# Altium schematic symbol library jlcpcb_2025_04_resistors_extended_2010.schlib: 1697 symbols (part 5 of 9) (continued)
## CR2010J27R0E04Z
designator R?  Resistance: 27Ω  (hidden comment: *)
Resistor, 27Ω, ±5%, 750mW, 200V, ±100ppm/℃, -55℃~+155℃, SMD 2010; Manufacturer: Uniroyal; Manufacturer Part Number: CR2010J27R0E04Z; Supplier 1: LCSC; Supplier Part Number 1: C175146; JLCPCB Part Number: C175146; Power Rating: 750mW; Category: Resistors; Package Size: 2010; JLCPCB Basic Part: Yes; Tolerance: ±5%; Voltage Rating: 200V; Temperature Coefficient: ±100ppm/℃; Temperature Rating: -55℃~+155℃; ComponentLink1Description: Datasheet; ComponentLink1URL: https://wmsc.lcsc.com/wmsc/upload/file/pdf/v2/lcsc/2304140030_Ever-Ohms-Tech-CR2010J27R0E04Z_C175146.pdf; ComponentLink2Description: JLCPCB Part URL; ComponentLink2URL: https://jlcpcb.com/partdetail/C175146
pins: 1, 2
1 alternate drawing of the same symbol

## CR2010J33K0E04Z
designator R?  Resistance: 33kΩ  (hidden comment: *)
Resistor, 33kΩ, ±5%, 750mW, 200V, ±100ppm/℃, -55℃~+155℃, SMD 2010; Manufacturer: Uniroyal; Manufacturer Part Number: CR2010J33K0E04Z; Supplier 1: LCSC; Supplier Part Number 1: C175178; JLCPCB Part Number: C175178; Power Rating: 750mW; Category: Resistors; Package Size: 2010; JLCPCB Basic Part: Yes; Tolerance: ±5%; Voltage Rating: 200V; Temperature Coefficient: ±100ppm/℃; Temperature Rating: -55℃~+155℃; ComponentLink1Description: Datasheet; ComponentLink1URL: https://wmsc.lcsc.com/wmsc/upload/file/pdf/v2/lcsc/2304140030_Ever-Ohms-Tech-CR2010J33K0E04Z_C175178.pdf; ComponentLink2Description: JLCPCB Part URL; ComponentLink2URL: https://jlcpcb.com/partdetail/C175178
pins: 1, 2
1 alternate drawing of the same symbol

## CR2010J33R0E04Z
designator R?  Resistance: 33Ω  (hidden comment: *)
Resistor, 33Ω, ±5%, 750mW, 200V, ±100ppm/℃, -55℃~+155℃, SMD 2010; Manufacturer: Uniroyal; Manufacturer Part Number: CR2010J33R0E04Z; Supplier 1: LCSC; Supplier Part Number 1: C175147; JLCPCB Part Number: C175147; Power Rating: 750mW; Category: Resistors; Package Size: 2010; JLCPCB Basic Part: Yes; Tolerance: ±5%; Voltage Rating: 200V; Temperature Coefficient: ±100ppm/℃; Temperature Rating: -55℃~+155℃; ComponentLink1Description: Datasheet; ComponentLink1URL: https://wmsc.lcsc.com/wmsc/upload/file/pdf/v2/lcsc/2304140030_Ever-Ohms-Tech-CR2010J33R0E04Z_C175147.pdf; ComponentLink2Description: JLCPCB Part URL; ComponentLink2URL: https://jlcpcb.com/partdetail/C175147
pins: 1, 2
1 alternate drawing of the same symbol

## CR2010J36R0E04Z
designator R?  Resistance: 36Ω  (hidden comment: *)
Resistor, 36Ω, ±5%, 750mW, 200V, ±100ppm/℃, -55℃~+155℃, SMD 2010; Manufacturer: Uniroyal; Manufacturer Part Number: CR2010J36R0E04Z; Supplier 1: LCSC; Supplier Part Number 1: C175148; JLCPCB Part Number: C175148; Power Rating: 750mW; Category: Resistors; Package Size: 2010; JLCPCB Basic Part: Yes; Tolerance: ±5%; Voltage Rating: 200V; Temperature Coefficient: ±100ppm/℃; Temperature Rating: -55℃~+155℃; ComponentLink1Description: Datasheet; ComponentLink1URL: https://wmsc.lcsc.com/wmsc/upload/file/pdf/v2/lcsc/2304140030_Ever-Ohms-Tech-CR2010J36R0E04Z_C175148.pdf; ComponentLink2Description: JLCPCB Part URL; ComponentLink2URL: https://jlcpcb.com/partdetail/C175148
pins: 1, 2
1 alternate drawing of the same symbol

## CR2010J39K0E04Z
designator R?  Resistance: 39kΩ  (hidden comment: *)
Resistor, 39kΩ, ±5%, 750mW, 200V, ±100ppm/℃, -55℃~+155℃, SMD 2010; Manufacturer: Uniroyal; Manufacturer Part Number: CR2010J39K0E04Z; Supplier 1: LCSC; Supplier Part Number 1: C147239; JLCPCB Part Number: C147239; Power Rating: 750mW; Category: Resistors; Package Size: 2010; JLCPCB Basic Part: Yes; Tolerance: ±5%; Voltage Rating: 200V; Temperature Coefficient: ±100ppm/℃; Temperature Rating: -55℃~+155℃; ComponentLink1Description: Datasheet; ComponentLink1URL: https://wmsc.lcsc.com/wmsc/upload/file/pdf/v2/lcsc/2304140030_Ever-Ohms-Tech-CR2010J39K0E04Z_C147239.pdf; ComponentLink2Description: JLCPCB Part URL; ComponentLink2URL: https://jlcpcb.com/partdetail/C147239
pins: 1, 2
1 alternate drawing of the same symbol

## CR2010J39R0E04Z
designator R?  Resistance: 39Ω  (hidden comment: *)
Resistor, 39Ω, ±5%, 750mW, 200V, ±100ppm/℃, -55℃~+155℃, SMD 2010; Manufacturer: Uniroyal; Manufacturer Part Number: CR2010J39R0E04Z; Supplier 1: LCSC; Supplier Part Number 1: C175149; JLCPCB Part Number: C175149; Power Rating: 750mW; Category: Resistors; Package Size: 2010; JLCPCB Basic Part: Yes; Tolerance: ±5%; Voltage Rating: 200V; Temperature Coefficient: ±100ppm/℃; Temperature Rating: -55℃~+155℃; ComponentLink1Description: Datasheet; ComponentLink1URL: https://wmsc.lcsc.com/wmsc/upload/file/pdf/v2/lcsc/2304140030_Ever-Ohms-Tech-CR2010J39R0E04Z_C175149.pdf; ComponentLink2Description: JLCPCB Part URL; ComponentLink2URL: https://jlcpcb.com/partdetail/C175149
pins: 1, 2
1 alternate drawing of the same symbol

## CR2010J47R0E04Z
designator R?  Resistance: 47Ω  (hidden comment: *)
Resistor, 47Ω, ±5%, 750mW, 200V, ±100ppm/℃, -55℃~+155℃, SMD 2010; Manufacturer: Uniroyal; Manufacturer Part Number: CR2010J47R0E04Z; Supplier 1: LCSC; Supplier Part Number 1: C146854; JLCPCB Part Number: C146854; Power Rating: 750mW; Category: Resistors; Package Size: 2010; JLCPCB Basic Part: Yes; Tolerance: ±5%; Voltage Rating: 200V; Temperature Coefficient: ±100ppm/℃; Temperature Rating: -55℃~+155℃; ComponentLink1Description: Datasheet; ComponentLink1URL: https://wmsc.lcsc.com/wmsc/upload/file/pdf/v2/lcsc/2304140030_Ever-Ohms-Tech-CR2010J47R0E04Z_C146854.pdf; ComponentLink2Description: JLCPCB Part URL; ComponentLink2URL: https://jlcpcb.com/partdetail/C146854
pins: 1, 2
1 alternate drawing of the same symbol

## CR2010J51K0E04Z
designator R?  Resistance: 51kΩ  (hidden comment: *)
Resistor, 51kΩ, ±5%, 750mW, 200V, ±200ppm/℃, -55℃~+155℃, SMD 2010; Manufacturer: Uniroyal; Manufacturer Part Number: CR2010J51K0E04Z; Supplier 1: LCSC; Supplier Part Number 1: C429680; JLCPCB Part Number: C429680; Power Rating: 750mW; Category: Resistors; Package Size: 2010; JLCPCB Basic Part: Yes; Tolerance: ±5%; Voltage Rating: 200V; Temperature Coefficient: ±200ppm/℃; Temperature Rating: -55℃~+155℃; ComponentLink1Description: Datasheet; ComponentLink1URL: https://wmsc.lcsc.com/wmsc/upload/file/pdf/v2/lcsc/2304140030_Ever-Ohms-Tech-CR2010J51K0E04Z_C429680.pdf; ComponentLink2Description: JLCPCB Part URL; ComponentLink2URL: https://jlcpcb.com/partdetail/C429680
pins: 1, 2
1 alternate drawing of the same symbol

## CR2010J56K0E04Z
designator R?  Resistance: 56kΩ  (hidden comment: *)
Resistor, 56kΩ, ±5%, 750mW, 200V, ±100ppm/℃, -55℃~+155℃, SMD 2010; Manufacturer: Uniroyal; Manufacturer Part Number: CR2010J56K0E04Z; Supplier 1: LCSC; Supplier Part Number 1: C146883; JLCPCB Part Number: C146883; Power Rating: 750mW; Category: Resistors; Package Size: 2010; JLCPCB Basic Part: Yes; Tolerance: ±5%; Voltage Rating: 200V; Temperature Coefficient: ±100ppm/℃; Temperature Rating: -55℃~+155℃; ComponentLink1Description: Datasheet; ComponentLink1URL: https://wmsc.lcsc.com/wmsc/upload/file/pdf/v2/lcsc/2304140030_Ever-Ohms-Tech-CR2010J56K0E04Z_C146883.pdf; ComponentLink2Description: JLCPCB Part URL; ComponentLink2URL: https://jlcpcb.com/partdetail/C146883
pins: 1, 2
1 alternate drawing of the same symbol

## CR2010J62K0E04Z
designator R?  Resistance: 62kΩ  (hidden comment: *)
Resistor, 62kΩ, ±5%, 750mW, 200V, ±100ppm/℃, -55℃~+155℃, SMD 2010; Manufacturer: Uniroyal; Manufacturer Part Number: CR2010J62K0E04Z; Supplier 1: LCSC; Supplier Part Number 1: C175184; JLCPCB Part Number: C175184; Power Rating: 750mW; Category: Resistors; Package Size: 2010; JLCPCB Basic Part: Yes; Tolerance: ±5%; Voltage Rating: 200V; Temperature Coefficient: ±100ppm/℃; Temperature Rating: -55℃~+155℃; ComponentLink1Description: Datasheet; ComponentLink1URL: https://wmsc.lcsc.com/wmsc/upload/file/pdf/v2/lcsc/2304140030_Ever-Ohms-Tech-CR2010J62K0E04Z_C175184.pdf; ComponentLink2Description: JLCPCB Part URL; ComponentLink2URL: https://jlcpcb.com/partdetail/C175184
pins: 1, 2
1 alternate drawing of the same symbol

## CR2010J62R0E04Z
designator R?  Resistance: 62Ω  (hidden comment: *)
Resistor, 62Ω, ±5%, 750mW, 200V, ±100ppm/℃, -55℃~+155℃, SMD 2010; Manufacturer: Uniroyal; Manufacturer Part Number: CR2010J62R0E04Z; Supplier 1: LCSC; Supplier Part Number 1: C146934; JLCPCB Part Number: C146934; Power Rating: 750mW; Category: Resistors; Package Size: 2010; JLCPCB Basic Part: Yes; Tolerance: ±5%; Voltage Rating: 200V; Temperature Coefficient: ±100ppm/℃; Temperature Rating: -55℃~+155℃; ComponentLink1Description: Datasheet; ComponentLink1URL: https://wmsc.lcsc.com/wmsc/upload/file/pdf/v2/lcsc/2304140030_Ever-Ohms-Tech-CR2010J62R0E04Z_C146934.pdf; ComponentLink2Description: JLCPCB Part URL; ComponentLink2URL: https://jlcpcb.com/partdetail/C146934
pins: 1, 2
1 alternate drawing of the same symbol

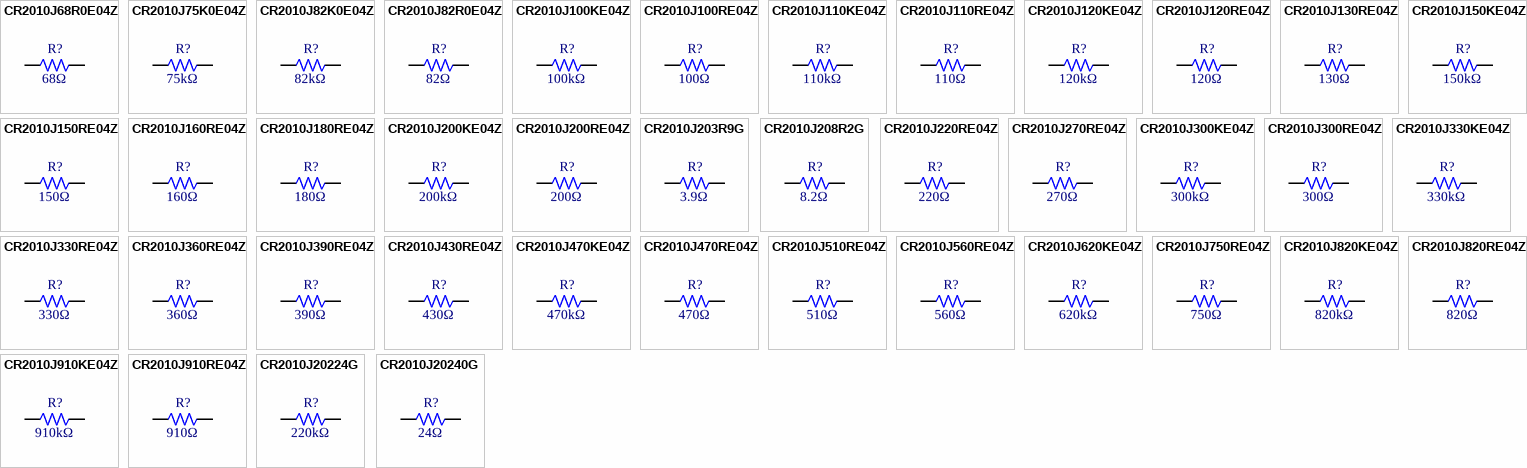
[diagram p21: symbols CR2010J68R0E04Z to CR2010J20240G]

## CR2010J68R0E04Z
designator R?  Resistance: 68Ω  (hidden comment: *)
Resistor, 68Ω, ±5%, 750mW, 200V, ±100ppm/℃, -55℃~+155℃, SMD 2010; Manufacturer: Uniroyal; Manufacturer Part Number: CR2010J68R0E04Z; Supplier 1: LCSC; Supplier Part Number 1: C146864; JLCPCB Part Number: C146864; Power Rating: 750mW; Category: Resistors; Package Size: 2010; JLCPCB Basic Part: Yes; Tolerance: ±5%; Voltage Rating: 200V; Temperature Coefficient: ±100ppm/℃; Temperature Rating: -55℃~+155℃; ComponentLink1Description: Datasheet; ComponentLink1URL: https://wmsc.lcsc.com/wmsc/upload/file/pdf/v2/lcsc/2304140030_Ever-Ohms-Tech-CR2010J68R0E04Z_C146864.pdf; ComponentLink2Description: JLCPCB Part URL; ComponentLink2URL: https://jlcpcb.com/partdetail/C146864
pins: 1, 2
1 alternate drawing of the same symbol

## CR2010J75K0E04Z
designator R?  Resistance: 75kΩ  (hidden comment: *)
Resistor, 75kΩ, ±5%, 750mW, 200V, ±100ppm/℃, -55℃~+155℃, SMD 2010; Manufacturer: Uniroyal; Manufacturer Part Number: CR2010J75K0E04Z; Supplier 1: LCSC; Supplier Part Number 1: C147240; JLCPCB Part Number: C147240; Power Rating: 750mW; Category: Resistors; Package Size: 2010; JLCPCB Basic Part: Yes; Tolerance: ±5%; Voltage Rating: 200V; Temperature Coefficient: ±100ppm/℃; Temperature Rating: -55℃~+155℃; ComponentLink1Description: Datasheet; ComponentLink1URL: https://wmsc.lcsc.com/wmsc/upload/file/pdf/v2/lcsc/2304140030_Ever-Ohms-Tech-CR2010J75K0E04Z_C147240.pdf; ComponentLink2Description: JLCPCB Part URL; ComponentLink2URL: https://jlcpcb.com/partdetail/C147240
pins: 1, 2
1 alternate drawing of the same symbol

## CR2010J82K0E04Z
designator R?  Resistance: 82kΩ  (hidden comment: *)
Resistor, 82kΩ, ±5%, 750mW, 200V, ±100ppm/℃, -55℃~+155℃, SMD 2010; Manufacturer: Uniroyal; Manufacturer Part Number: CR2010J82K0E04Z; Supplier 1: LCSC; Supplier Part Number 1: C165328; JLCPCB Part Number: C165328; Power Rating: 750mW; Category: Resistors; Package Size: 2010; JLCPCB Basic Part: Yes; Tolerance: ±5%; Voltage Rating: 200V; Temperature Coefficient: ±100ppm/℃; Temperature Rating: -55℃~+155℃; ComponentLink1Description: Datasheet; ComponentLink1URL: https://wmsc.lcsc.com/wmsc/upload/file/pdf/v2/lcsc/2304140030_Ever-Ohms-Tech-CR2010J82K0E04Z_C165328.pdf; ComponentLink2Description: JLCPCB Part URL; ComponentLink2URL: https://jlcpcb.com/partdetail/C165328
pins: 1, 2
1 alternate drawing of the same symbol

## CR2010J82R0E04Z
designator R?  Resistance: 82Ω  (hidden comment: *)
Resistor, 82Ω, ±5%, 750mW, 200V, ±100ppm/℃, -55℃~+155℃, SMD 2010; Manufacturer: Uniroyal; Manufacturer Part Number: CR2010J82R0E04Z; Supplier 1: LCSC; Supplier Part Number 1: C175151; JLCPCB Part Number: C175151; Power Rating: 750mW; Category: Resistors; Package Size: 2010; JLCPCB Basic Part: Yes; Tolerance: ±5%; Voltage Rating: 200V; Temperature Coefficient: ±100ppm/℃; Temperature Rating: -55℃~+155℃; ComponentLink1Description: Datasheet; ComponentLink1URL: https://wmsc.lcsc.com/wmsc/upload/file/pdf/v2/lcsc/2304140030_Ever-Ohms-Tech-CR2010J82R0E04Z_C175151.pdf; ComponentLink2Description: JLCPCB Part URL; ComponentLink2URL: https://jlcpcb.com/partdetail/C175151
pins: 1, 2
1 alternate drawing of the same symbol

## CR2010J100KE04Z
designator R?  Resistance: 100kΩ  (hidden comment: *)
Resistor, 100kΩ, ±5%, 750mW, 200V, ±100ppm/℃, -55℃~+155℃, SMD 2010; Manufacturer: Uniroyal; Manufacturer Part Number: CR2010J100KE04Z; Supplier 1: LCSC; Supplier Part Number 1: C146846; JLCPCB Part Number: C146846; Power Rating: 750mW; Category: Resistors; Package Size: 2010; JLCPCB Basic Part: Yes; Tolerance: ±5%; Voltage Rating: 200V; Temperature Coefficient: ±100ppm/℃; Temperature Rating: -55℃~+155℃; ComponentLink1Description: Datasheet; ComponentLink1URL: https://wmsc.lcsc.com/wmsc/upload/file/pdf/v2/lcsc/2304140030_Ever-Ohms-Tech-CR2010J100KE04Z_C146846.pdf; ComponentLink2Description: JLCPCB Part URL; ComponentLink2URL: https://jlcpcb.com/partdetail/C146846
pins: 1, 2
1 alternate drawing of the same symbol

## CR2010J100RE04Z
designator R?  Resistance: 100Ω  (hidden comment: *)
Resistor, 100Ω, ±5%, 750mW, 200V, ±100ppm/℃, -55℃~+155℃, SMD 2010; Manufacturer: Uniroyal; Manufacturer Part Number: CR2010J100RE04Z; Supplier 1: LCSC; Supplier Part Number 1: C146837; JLCPCB Part Number: C146837; Power Rating: 750mW; Category: Resistors; Package Size: 2010; JLCPCB Basic Part: Yes; Tolerance: ±5%; Voltage Rating: 200V; Temperature Coefficient: ±100ppm/℃; Temperature Rating: -55℃~+155℃; ComponentLink1Description: Datasheet; ComponentLink1URL: https://wmsc.lcsc.com/wmsc/upload/file/pdf/v2/lcsc/2304140030_Ever-Ohms-Tech-CR2010J100RE04Z_C146837.pdf; ComponentLink2Description: JLCPCB Part URL; ComponentLink2URL: https://jlcpcb.com/partdetail/C146837
pins: 1, 2
1 alternate drawing of the same symbol

## CR2010J110KE04Z
designator R?  Resistance: 110kΩ  (hidden comment: *)
Resistor, 110kΩ, ±5%, 750mW, 200V, ±100ppm/℃, -55℃~+155℃, SMD 2010; Manufacturer: Uniroyal; Manufacturer Part Number: CR2010J110KE04Z; Supplier 1: LCSC; Supplier Part Number 1: C175187; JLCPCB Part Number: C175187; Power Rating: 750mW; Category: Resistors; Package Size: 2010; JLCPCB Basic Part: Yes; Tolerance: ±5%; Voltage Rating: 200V; Temperature Coefficient: ±100ppm/℃; Temperature Rating: -55℃~+155℃; ComponentLink1Description: Datasheet; ComponentLink1URL: https://wmsc.lcsc.com/wmsc/upload/file/pdf/v2/lcsc/2304140030_Ever-Ohms-Tech-CR2010J110KE04Z_C175187.pdf; ComponentLink2Description: JLCPCB Part URL; ComponentLink2URL: https://jlcpcb.com/partdetail/C175187
pins: 1, 2
1 alternate drawing of the same symbol

## CR2010J110RE04Z
designator R?  Resistance: 110Ω  (hidden comment: *)
Resistor, 110Ω, ±5%, 750mW, 200V, ±100ppm/℃, -55℃~+155℃, SMD 2010; Manufacturer: Uniroyal; Manufacturer Part Number: CR2010J110RE04Z; Supplier 1: LCSC; Supplier Part Number 1: C146881; JLCPCB Part Number: C146881; Power Rating: 750mW; Category: Resistors; Package Size: 2010; JLCPCB Basic Part: Yes; Tolerance: ±5%; Voltage Rating: 200V; Temperature Coefficient: ±100ppm/℃; Temperature Rating: -55℃~+155℃; ComponentLink1Description: Datasheet; ComponentLink1URL: https://wmsc.lcsc.com/wmsc/upload/file/pdf/v2/lcsc/2304140030_Ever-Ohms-Tech-CR2010J110RE04Z_C146881.pdf; ComponentLink2Description: JLCPCB Part URL; ComponentLink2URL: https://jlcpcb.com/partdetail/C146881
pins: 1, 2
1 alternate drawing of the same symbol

## CR2010J120KE04Z
designator R?  Resistance: 120kΩ  (hidden comment: *)
Resistor, 120kΩ, ±5%, 750mW, 200V, ±100ppm/℃, -55℃~+155℃, SMD 2010; Manufacturer: Uniroyal; Manufacturer Part Number: CR2010J120KE04Z; Supplier 1: LCSC; Supplier Part Number 1: C147238; JLCPCB Part Number: C147238; Power Rating: 750mW; Category: Resistors; Package Size: 2010; JLCPCB Basic Part: Yes; Tolerance: ±5%; Voltage Rating: 200V; Temperature Coefficient: ±100ppm/℃; Temperature Rating: -55℃~+155℃; ComponentLink1Description: Datasheet; ComponentLink1URL: https://wmsc.lcsc.com/wmsc/upload/file/pdf/v2/lcsc/2304140030_Ever-Ohms-Tech-CR2010J120KE04Z_C147238.pdf; ComponentLink2Description: JLCPCB Part URL; ComponentLink2URL: https://jlcpcb.com/partdetail/C147238
pins: 1, 2
1 alternate drawing of the same symbol

## CR2010J120RE04Z
designator R?  Resistance: 120Ω  (hidden comment: *)
Resistor, 120Ω, ±5%, 750mW, 200V, ±100ppm/℃, -55℃~+155℃, SMD 2010; Manufacturer: Uniroyal; Manufacturer Part Number: CR2010J120RE04Z; Supplier 1: LCSC; Supplier Part Number 1: C175152; JLCPCB Part Number: C175152; Power Rating: 750mW; Category: Resistors; Package Size: 2010; JLCPCB Basic Part: Yes; Tolerance: ±5%; Voltage Rating: 200V; Temperature Coefficient: ±100ppm/℃; Temperature Rating: -55℃~+155℃; ComponentLink1Description: Datasheet; ComponentLink1URL: https://wmsc.lcsc.com/wmsc/upload/file/pdf/v2/lcsc/2304140030_Ever-Ohms-Tech-CR2010J120RE04Z_C175152.pdf; ComponentLink2Description: JLCPCB Part URL; ComponentLink2URL: https://jlcpcb.com/partdetail/C175152
pins: 1, 2
1 alternate drawing of the same symbol

## CR2010J130RE04Z
designator R?  Resistance: 130Ω  (hidden comment: *)
Resistor, 130Ω, ±5%, 750mW, 200V, ±100ppm/℃, -55℃~+155℃, SMD 2010; Manufacturer: Uniroyal; Manufacturer Part Number: CR2010J130RE04Z; Supplier 1: LCSC; Supplier Part Number 1: C175153; JLCPCB Part Number: C175153; Power Rating: 750mW; Category: Resistors; Package Size: 2010; JLCPCB Basic Part: Yes; Tolerance: ±5%; Voltage Rating: 200V; Temperature Coefficient: ±100ppm/℃; Temperature Rating: -55℃~+155℃; ComponentLink1Description: Datasheet; ComponentLink1URL: https://wmsc.lcsc.com/wmsc/upload/file/pdf/v2/lcsc/2304140030_Ever-Ohms-Tech-CR2010J130RE04Z_C175153.pdf; ComponentLink2Description: JLCPCB Part URL; ComponentLink2URL: https://jlcpcb.com/partdetail/C175153
pins: 1, 2
1 alternate drawing of the same symbol

## CR2010J150KE04Z
designator R?  Resistance: 150kΩ  (hidden comment: *)
Resistor, 150kΩ, ±5%, 750mW, 200V, ±100ppm/℃, -55℃~+155℃, SMD 2010; Manufacturer: Uniroyal; Manufacturer Part Number: CR2010J150KE04Z; Supplier 1: LCSC; Supplier Part Number 1: C175189; JLCPCB Part Number: C175189; Power Rating: 750mW; Category: Resistors; Package Size: 2010; JLCPCB Basic Part: Yes; Tolerance: ±5%; Voltage Rating: 200V; Temperature Coefficient: ±100ppm/℃; Temperature Rating: -55℃~+155℃; ComponentLink1Description: Datasheet; ComponentLink1URL: https://wmsc.lcsc.com/wmsc/upload/file/pdf/v2/lcsc/2304140030_Ever-Ohms-Tech-CR2010J150KE04Z_C175189.pdf; ComponentLink2Description: JLCPCB Part URL; ComponentLink2URL: https://jlcpcb.com/partdetail/C175189
pins: 1, 2
1 alternate drawing of the same symbol

## CR2010J150RE04Z
designator R?  Resistance: 150Ω  (hidden comment: *)
Resistor, 150Ω, ±5%, 750mW, 200V, ±100ppm/℃, -55℃~+155℃, SMD 2010; Manufacturer: Uniroyal; Manufacturer Part Number: CR2010J150RE04Z; Supplier 1: LCSC; Supplier Part Number 1: C146844; JLCPCB Part Number: C146844; Power Rating: 750mW; Category: Resistors; Package Size: 2010; JLCPCB Basic Part: Yes; Tolerance: ±5%; Voltage Rating: 200V; Temperature Coefficient: ±100ppm/℃; Temperature Rating: -55℃~+155℃; ComponentLink1Description: Datasheet; ComponentLink1URL: https://wmsc.lcsc.com/wmsc/upload/file/pdf/v2/lcsc/2304140030_Ever-Ohms-Tech-CR2010J150RE04Z_C146844.pdf; ComponentLink2Description: JLCPCB Part URL; ComponentLink2URL: https://jlcpcb.com/partdetail/C146844
pins: 1, 2
1 alternate drawing of the same symbol

## CR2010J160RE04Z
designator R?  Resistance: 160Ω  (hidden comment: *)
Resistor, 160Ω, ±5%, 750mW, 200V, ±100ppm/℃, -55℃~+155℃, SMD 2010; Manufacturer: Uniroyal; Manufacturer Part Number: CR2010J160RE04Z; Supplier 1: LCSC; Supplier Part Number 1: C175154; JLCPCB Part Number: C175154; Power Rating: 750mW; Category: Resistors; Package Size: 2010; JLCPCB Basic Part: Yes; Tolerance: ±5%; Voltage Rating: 200V; Temperature Coefficient: ±100ppm/℃; Temperature Rating: -55℃~+155℃; ComponentLink1Description: Datasheet; ComponentLink1URL: https://wmsc.lcsc.com/wmsc/upload/file/pdf/v2/lcsc/2304140030_Ever-Ohms-Tech-CR2010J160RE04Z_C175154.pdf; ComponentLink2Description: JLCPCB Part URL; ComponentLink2URL: https://jlcpcb.com/partdetail/C175154
pins: 1, 2
1 alternate drawing of the same symbol

## CR2010J180RE04Z
designator R?  Resistance: 180Ω  (hidden comment: *)
Resistor, 180Ω, ±5%, 750mW, 200V, ±100ppm/℃, -55℃~+155℃, SMD 2010; Manufacturer: Uniroyal; Manufacturer Part Number: CR2010J180RE04Z; Supplier 1: LCSC; Supplier Part Number 1: C175155; JLCPCB Part Number: C175155; Power Rating: 750mW; Category: Resistors; Package Size: 2010; JLCPCB Basic Part: Yes; Tolerance: ±5%; Voltage Rating: 200V; Temperature Coefficient: ±100ppm/℃; Temperature Rating: -55℃~+155℃; ComponentLink1Description: Datasheet; ComponentLink1URL: https://wmsc.lcsc.com/wmsc/upload/file/pdf/v2/lcsc/2304140030_Ever-Ohms-Tech-CR2010J180RE04Z_C175155.pdf; ComponentLink2Description: JLCPCB Part URL; ComponentLink2URL: https://jlcpcb.com/partdetail/C175155
pins: 1, 2
1 alternate drawing of the same symbol

## CR2010J200KE04Z
designator R?  Resistance: 200kΩ  (hidden comment: *)
Resistor, 200kΩ, ±5%, 750mW, 200V, ±100ppm/℃, -55℃~+155℃, SMD 2010; Manufacturer: Uniroyal; Manufacturer Part Number: CR2010J200KE04Z; Supplier 1: LCSC; Supplier Part Number 1: C147043; JLCPCB Part Number: C147043; Power Rating: 750mW; Category: Resistors; Package Size: 2010; JLCPCB Basic Part: Yes; Tolerance: ±5%; Voltage Rating: 200V; Temperature Coefficient: ±100ppm/℃; Temperature Rating: -55℃~+155℃; ComponentLink1Description: Datasheet; ComponentLink1URL: https://wmsc.lcsc.com/wmsc/upload/file/pdf/v2/lcsc/2304140030_Ever-Ohms-Tech-CR2010J200KE04Z_C147043.pdf; ComponentLink2Description: JLCPCB Part URL; ComponentLink2URL: https://jlcpcb.com/partdetail/C147043
pins: 1, 2
1 alternate drawing of the same symbol

## CR2010J200RE04Z
designator R?  Resistance: 200Ω  (hidden comment: *)
Resistor, 200Ω, ±5%, 750mW, 200V, ±100ppm/℃, -55℃~+155℃, SMD 2010; Manufacturer: Uniroyal; Manufacturer Part Number: CR2010J200RE04Z; Supplier 1: LCSC; Supplier Part Number 1: C146954; JLCPCB Part Number: C146954; Power Rating: 750mW; Category: Resistors; Package Size: 2010; JLCPCB Basic Part: Yes; Tolerance: ±5%; Voltage Rating: 200V; Temperature Coefficient: ±100ppm/℃; Temperature Rating: -55℃~+155℃; ComponentLink1Description: Datasheet; ComponentLink1URL: https://wmsc.lcsc.com/wmsc/upload/file/pdf/v2/lcsc/2304140030_Ever-Ohms-Tech-CR2010J200RE04Z_C146954.pdf; ComponentLink2Description: JLCPCB Part URL; ComponentLink2URL: https://jlcpcb.com/partdetail/C146954
pins: 1, 2
1 alternate drawing of the same symbol

## CR2010J203R9G
designator R?  Resistance: 3.9Ω  (hidden comment: *)
Resistor, 3.9Ω, ±5%, 200V, SMD 2010; Manufacturer: Uniroyal; Manufacturer Part Number: CR2010J203R9G; Supplier 1: LCSC; Supplier Part Number 1: C3037262; JLCPCB Part Number: C3037262; Category: Resistors; Package Size: 2010; JLCPCB Basic Part: Yes; Tolerance: ±5%; Voltage Rating: 200V; ComponentLink1Description: Datasheet; ComponentLink1URL: https://wmsc.lcsc.com/wmsc/upload/file/pdf/v2/lcsc/2206222045_LIZ-Elec-CR2010J203R9G_C3037262.pdf; ComponentLink2Description: JLCPCB Part URL; ComponentLink2URL: https://jlcpcb.com/partdetail/C3037262
pins: 1, 2
1 alternate drawing of the same symbol

## CR2010J208R2G
designator R?  Resistance: 8.2Ω  (hidden comment: *)
Resistor, 8.2Ω, ±5%, 500mW, 200V, -250ppm/℃~+500ppm/℃, -55℃~+125℃, SMD 2010; Manufacturer: Uniroyal; Manufacturer Part Number: CR2010J208R2G; Supplier 1: LCSC; Supplier Part Number 1: C102519; JLCPCB Part Number: C102519; Power Rating: 500mW; Category: Resistors; Package Size: 2010; JLCPCB Basic Part: Yes; Tolerance: ±5%; Voltage Rating: 200V; Temperature Coefficient: -250ppm/℃~+500ppm/℃; Temperature Rating: -55℃~+125℃; ComponentLink1Description: Datasheet; ComponentLink1URL: https://wmsc.lcsc.com/wmsc/upload/file/pdf/v2/lcsc/2304140030_LIZ-Elec-CR2010J208R2G_C102519.pdf; ComponentLink2Description: JLCPCB Part URL; ComponentLink2URL: https://jlcpcb.com/partdetail/C102519
pins: 1, 2
1 alternate drawing of the same symbol

## CR2010J220RE04Z
designator R?  Resistance: 220Ω  (hidden comment: *)
Resistor, 220Ω, ±5%, 750mW, 200V, ±100ppm/℃, -55℃~+155℃, SMD 2010; Manufacturer: Uniroyal; Manufacturer Part Number: CR2010J220RE04Z; Supplier 1: LCSC; Supplier Part Number 1: C146857; JLCPCB Part Number: C146857; Power Rating: 750mW; Category: Resistors; Package Size: 2010; JLCPCB Basic Part: Yes; Tolerance: ±5%; Voltage Rating: 200V; Temperature Coefficient: ±100ppm/℃; Temperature Rating: -55℃~+155℃; ComponentLink1Description: Datasheet; ComponentLink1URL: https://wmsc.lcsc.com/wmsc/upload/file/pdf/v2/lcsc/2304140030_Ever-Ohms-Tech-CR2010J220RE04Z_C146857.pdf; ComponentLink2Description: JLCPCB Part URL; ComponentLink2URL: https://jlcpcb.com/partdetail/C146857
pins: 1, 2
1 alternate drawing of the same symbol

## CR2010J270RE04Z
designator R?  Resistance: 270Ω  (hidden comment: *)
Resistor, 270Ω, ±5%, 750mW, 200V, ±100ppm/℃, -55℃~+155℃, SMD 2010; Manufacturer: Uniroyal; Manufacturer Part Number: CR2010J270RE04Z; Supplier 1: LCSC; Supplier Part Number 1: C146843; JLCPCB Part Number: C146843; Power Rating: 750mW; Category: Resistors; Package Size: 2010; JLCPCB Basic Part: Yes; Tolerance: ±5%; Voltage Rating: 200V; Temperature Coefficient: ±100ppm/℃; Temperature Rating: -55℃~+155℃; ComponentLink1Description: Datasheet; ComponentLink1URL: https://wmsc.lcsc.com/wmsc/upload/file/pdf/v2/lcsc/2304140030_Ever-Ohms-Tech-CR2010J270RE04Z_C146843.pdf; ComponentLink2Description: JLCPCB Part URL; ComponentLink2URL: https://jlcpcb.com/partdetail/C146843
pins: 1, 2
1 alternate drawing of the same symbol

## CR2010J300KE04Z
designator R?  Resistance: 300kΩ  (hidden comment: *)
Resistor, 300kΩ, ±5%, 750mW, 200V, ±100ppm/℃, -55℃~+155℃, SMD 2010; Manufacturer: Uniroyal; Manufacturer Part Number: CR2010J300KE04Z; Supplier 1: LCSC; Supplier Part Number 1: C175192; JLCPCB Part Number: C175192; Power Rating: 750mW; Category: Resistors; Package Size: 2010; JLCPCB Basic Part: Yes; Tolerance: ±5%; Voltage Rating: 200V; Temperature Coefficient: ±100ppm/℃; Temperature Rating: -55℃~+155℃; ComponentLink1Description: Datasheet; ComponentLink1URL: https://wmsc.lcsc.com/wmsc/upload/file/pdf/v2/lcsc/2304140030_Ever-Ohms-Tech-CR2010J300KE04Z_C175192.pdf; ComponentLink2Description: JLCPCB Part URL; ComponentLink2URL: https://jlcpcb.com/partdetail/C175192
pins: 1, 2
1 alternate drawing of the same symbol

## CR2010J300RE04Z
designator R?  Resistance: 300Ω  (hidden comment: *)
Resistor, 300Ω, ±5%, 750mW, 200V, ±100ppm/℃, -55℃~+155℃, SMD 2010; Manufacturer: Uniroyal; Manufacturer Part Number: CR2010J300RE04Z; Supplier 1: LCSC; Supplier Part Number 1: C146841; JLCPCB Part Number: C146841; Power Rating: 750mW; Category: Resistors; Package Size: 2010; JLCPCB Basic Part: Yes; Tolerance: ±5%; Voltage Rating: 200V; Temperature Coefficient: ±100ppm/℃; Temperature Rating: -55℃~+155℃; ComponentLink1Description: Datasheet; ComponentLink1URL: https://wmsc.lcsc.com/wmsc/upload/file/pdf/v2/lcsc/2304140030_Ever-Ohms-Tech-CR2010J300RE04Z_C146841.pdf; ComponentLink2Description: JLCPCB Part URL; ComponentLink2URL: https://jlcpcb.com/partdetail/C146841
pins: 1, 2
1 alternate drawing of the same symbol

## CR2010J330KE04Z
designator R?  Resistance: 330kΩ  (hidden comment: *)
Resistor, 330kΩ, ±5%, 750mW, 200V, ±100ppm/℃, -55℃~+155℃, SMD 2010; Manufacturer: Uniroyal; Manufacturer Part Number: CR2010J330KE04Z; Supplier 1: LCSC; Supplier Part Number 1: C165341; JLCPCB Part Number: C165341; Power Rating: 750mW; Category: Resistors; Package Size: 2010; JLCPCB Basic Part: Yes; Tolerance: ±5%; Voltage Rating: 200V; Temperature Coefficient: ±100ppm/℃; Temperature Rating: -55℃~+155℃; ComponentLink1Description: Datasheet; ComponentLink1URL: https://wmsc.lcsc.com/wmsc/upload/file/pdf/v2/lcsc/2304140030_Ever-Ohms-Tech-CR2010J330KE04Z_C165341.pdf; ComponentLink2Description: JLCPCB Part URL; ComponentLink2URL: https://jlcpcb.com/partdetail/C165341
pins: 1, 2
1 alternate drawing of the same symbol

## CR2010J330RE04Z
designator R?  Resistance: 330Ω  (hidden comment: *)
Resistor, 330Ω, ±5%, 750mW, 200V, ±100ppm/℃, -55℃~+155℃, SMD 2010; Manufacturer: Uniroyal; Manufacturer Part Number: CR2010J330RE04Z; Supplier 1: LCSC; Supplier Part Number 1: C146875; JLCPCB Part Number: C146875; Power Rating: 750mW; Category: Resistors; Package Size: 2010; JLCPCB Basic Part: Yes; Tolerance: ±5%; Voltage Rating: 200V; Temperature Coefficient: ±100ppm/℃; Temperature Rating: -55℃~+155℃; ComponentLink1Description: Datasheet; ComponentLink1URL: https://wmsc.lcsc.com/wmsc/upload/file/pdf/v2/lcsc/2304140030_Ever-Ohms-Tech-CR2010J330RE04Z_C146875.pdf; ComponentLink2Description: JLCPCB Part URL; ComponentLink2URL: https://jlcpcb.com/partdetail/C146875
pins: 1, 2
1 alternate drawing of the same symbol

## CR2010J360RE04Z
designator R?  Resistance: 360Ω  (hidden comment: *)
Resistor, 360Ω, ±5%, 750mW, 200V, ±100ppm/℃, -55℃~+155℃, SMD 2010; Manufacturer: Uniroyal; Manufacturer Part Number: CR2010J360RE04Z; Supplier 1: LCSC; Supplier Part Number 1: C147117; JLCPCB Part Number: C147117; Power Rating: 750mW; Category: Resistors; Package Size: 2010; JLCPCB Basic Part: Yes; Tolerance: ±5%; Voltage Rating: 200V; Temperature Coefficient: ±100ppm/℃; Temperature Rating: -55℃~+155℃; ComponentLink1Description: Datasheet; ComponentLink1URL: https://wmsc.lcsc.com/wmsc/upload/file/pdf/v2/lcsc/2304140030_Ever-Ohms-Tech-CR2010J360RE04Z_C147117.pdf; ComponentLink2Description: JLCPCB Part URL; ComponentLink2URL: https://jlcpcb.com/partdetail/C147117
pins: 1, 2
1 alternate drawing of the same symbol

## CR2010J390RE04Z
designator R?  Resistance: 390Ω  (hidden comment: *)
Resistor, 390Ω, ±5%, 750mW, 200V, ±100ppm/℃, -55℃~+155℃, SMD 2010; Manufacturer: Uniroyal; Manufacturer Part Number: CR2010J390RE04Z; Supplier 1: LCSC; Supplier Part Number 1: C146840; JLCPCB Part Number: C146840; Power Rating: 750mW; Category: Resistors; Package Size: 2010; JLCPCB Basic Part: Yes; Tolerance: ±5%; Voltage Rating: 200V; Temperature Coefficient: ±100ppm/℃; Temperature Rating: -55℃~+155℃; ComponentLink1Description: Datasheet; ComponentLink1URL: https://wmsc.lcsc.com/wmsc/upload/file/pdf/v2/lcsc/2304140030_Ever-Ohms-Tech-CR2010J390RE04Z_C146840.pdf; ComponentLink2Description: JLCPCB Part URL; ComponentLink2URL: https://jlcpcb.com/partdetail/C146840
pins: 1, 2
1 alternate drawing of the same symbol

## CR2010J430RE04Z
designator R?  Resistance: 430Ω  (hidden comment: *)
Resistor, 430Ω, ±5%, 750mW, 200V, ±100ppm/℃, -55℃~+155℃, SMD 2010; Manufacturer: Uniroyal; Manufacturer Part Number: CR2010J430RE04Z; Supplier 1: LCSC; Supplier Part Number 1: C175158; JLCPCB Part Number: C175158; Power Rating: 750mW; Category: Resistors; Package Size: 2010; JLCPCB Basic Part: Yes; Tolerance: ±5%; Voltage Rating: 200V; Temperature Coefficient: ±100ppm/℃; Temperature Rating: -55℃~+155℃; ComponentLink1Description: Datasheet; ComponentLink1URL: https://wmsc.lcsc.com/wmsc/upload/file/pdf/v2/lcsc/2304140030_Ever-Ohms-Tech-CR2010J430RE04Z_C175158.pdf; ComponentLink2Description: JLCPCB Part URL; ComponentLink2URL: https://jlcpcb.com/partdetail/C175158
pins: 1, 2
1 alternate drawing of the same symbol

## CR2010J470KE04Z
designator R?  Resistance: 470kΩ  (hidden comment: *)
Resistor, 470kΩ, ±5%, 750mW, 200V, ±100ppm/℃, -55℃~+155℃, SMD 2010; Manufacturer: Uniroyal; Manufacturer Part Number: CR2010J470KE04Z; Supplier 1: LCSC; Supplier Part Number 1: C146923; JLCPCB Part Number: C146923; Power Rating: 750mW; Category: Resistors; Package Size: 2010; JLCPCB Basic Part: Yes; Tolerance: ±5%; Voltage Rating: 200V; Temperature Coefficient: ±100ppm/℃; Temperature Rating: -55℃~+155℃; ComponentLink1Description: Datasheet; ComponentLink1URL: https://wmsc.lcsc.com/wmsc/upload/file/pdf/v2/lcsc/2304140030_Ever-Ohms-Tech-CR2010J470KE04Z_C146923.pdf; ComponentLink2Description: JLCPCB Part URL; ComponentLink2URL: https://jlcpcb.com/partdetail/C146923
pins: 1, 2
1 alternate drawing of the same symbol

## CR2010J470RE04Z
designator R?  Resistance: 470Ω  (hidden comment: *)
Resistor, 470Ω, ±5%, 750mW, 200V, ±100ppm/℃, -55℃~+155℃, SMD 2010; Manufacturer: Uniroyal; Manufacturer Part Number: CR2010J470RE04Z; Supplier 1: LCSC; Supplier Part Number 1: C146940; JLCPCB Part Number: C146940; Power Rating: 750mW; Category: Resistors; Package Size: 2010; JLCPCB Basic Part: Yes; Tolerance: ±5%; Voltage Rating: 200V; Temperature Coefficient: ±100ppm/℃; Temperature Rating: -55℃~+155℃; ComponentLink1Description: Datasheet; ComponentLink1URL: https://wmsc.lcsc.com/wmsc/upload/file/pdf/v2/lcsc/2304140030_Ever-Ohms-Tech-CR2010J470RE04Z_C146940.pdf; ComponentLink2Description: JLCPCB Part URL; ComponentLink2URL: https://jlcpcb.com/partdetail/C146940
pins: 1, 2
1 alternate drawing of the same symbol

## CR2010J510RE04Z
designator R?  Resistance: 510Ω  (hidden comment: *)
Resistor, 510Ω, ±5%, 750mW, 200V, ±100ppm/℃, -55℃~+155℃, SMD 2010; Manufacturer: Uniroyal; Manufacturer Part Number: CR2010J510RE04Z; Supplier 1: LCSC; Supplier Part Number 1: C146988; JLCPCB Part Number: C146988; Power Rating: 750mW; Category: Resistors; Package Size: 2010; JLCPCB Basic Part: Yes; Tolerance: ±5%; Voltage Rating: 200V; Temperature Coefficient: ±100ppm/℃; Temperature Rating: -55℃~+155℃; ComponentLink1Description: Datasheet; ComponentLink1URL: https://wmsc.lcsc.com/wmsc/upload/file/pdf/v2/lcsc/2304140030_Ever-Ohms-Tech-CR2010J510RE04Z_C146988.pdf; ComponentLink2Description: JLCPCB Part URL; ComponentLink2URL: https://jlcpcb.com/partdetail/C146988
pins: 1, 2
1 alternate drawing of the same symbol

## CR2010J560RE04Z
designator R?  Resistance: 560Ω  (hidden comment: *)
Resistor, 560Ω, ±5%, 750mW, 200V, ±100ppm/℃, -55℃~+155℃, SMD 2010; Manufacturer: Uniroyal; Manufacturer Part Number: CR2010J560RE04Z; Supplier 1: LCSC; Supplier Part Number 1: C175160; JLCPCB Part Number: C175160; Power Rating: 750mW; Category: Resistors; Package Size: 2010; JLCPCB Basic Part: Yes; Tolerance: ±5%; Voltage Rating: 200V; Temperature Coefficient: ±100ppm/℃; Temperature Rating: -55℃~+155℃; ComponentLink1Description: Datasheet; ComponentLink1URL: https://wmsc.lcsc.com/wmsc/upload/file/pdf/v2/lcsc/2304140030_Ever-Ohms-Tech-CR2010J560RE04Z_C175160.pdf; ComponentLink2Description: JLCPCB Part URL; ComponentLink2URL: https://jlcpcb.com/partdetail/C175160
pins: 1, 2
1 alternate drawing of the same symbol

## CR2010J620KE04Z
designator R?  Resistance: 620kΩ  (hidden comment: *)
Resistor, 620kΩ, ±5%, 750mW, 200V, ±100ppm/℃, -55℃~+155℃, SMD 2010; Manufacturer: Uniroyal; Manufacturer Part Number: CR2010J620KE04Z; Supplier 1: LCSC; Supplier Part Number 1: C175195; JLCPCB Part Number: C175195; Power Rating: 750mW; Category: Resistors; Package Size: 2010; JLCPCB Basic Part: Yes; Tolerance: ±5%; Voltage Rating: 200V; Temperature Coefficient: ±100ppm/℃; Temperature Rating: -55℃~+155℃; ComponentLink1Description: Datasheet; ComponentLink1URL: https://wmsc.lcsc.com/wmsc/upload/file/pdf/v2/lcsc/2304140030_Ever-Ohms-Tech-CR2010J620KE04Z_C175195.pdf; ComponentLink2Description: JLCPCB Part URL; ComponentLink2URL: https://jlcpcb.com/partdetail/C175195
pins: 1, 2
1 alternate drawing of the same symbol

## CR2010J750RE04Z
designator R?  Resistance: 750Ω  (hidden comment: *)
Resistor, 750Ω, ±5%, 750mW, 200V, ±100ppm/℃, -55℃~+155℃, SMD 2010; Manufacturer: Uniroyal; Manufacturer Part Number: CR2010J750RE04Z; Supplier 1: LCSC; Supplier Part Number 1: C165329; JLCPCB Part Number: C165329; Power Rating: 750mW; Category: Resistors; Package Size: 2010; JLCPCB Basic Part: Yes; Tolerance: ±5%; Voltage Rating: 200V; Temperature Coefficient: ±100ppm/℃; Temperature Rating: -55℃~+155℃; ComponentLink1Description: Datasheet; ComponentLink1URL: https://wmsc.lcsc.com/wmsc/upload/file/pdf/v2/lcsc/2404011707_Ever-Ohms-Tech-CR2010J750RE04Z_C165329.pdf; ComponentLink2Description: JLCPCB Part URL; ComponentLink2URL: https://jlcpcb.com/partdetail/C165329
pins: 1, 2
1 alternate drawing of the same symbol

## CR2010J820KE04Z
designator R?  Resistance: 820kΩ  (hidden comment: *)
Resistor, 820kΩ, ±5%, 750mW, 200V, ±100ppm/℃, -55℃~+155℃, SMD 2010; Manufacturer: Uniroyal; Manufacturer Part Number: CR2010J820KE04Z; Supplier 1: LCSC; Supplier Part Number 1: C175199; JLCPCB Part Number: C175199; Power Rating: 750mW; Category: Resistors; Package Size: 2010; JLCPCB Basic Part: Yes; Tolerance: ±5%; Voltage Rating: 200V; Temperature Coefficient: ±100ppm/℃; Temperature Rating: -55℃~+155℃; ComponentLink1Description: Datasheet; ComponentLink1URL: https://wmsc.lcsc.com/wmsc/upload/file/pdf/v2/lcsc/2304140030_Ever-Ohms-Tech-CR2010J820KE04Z_C175199.pdf; ComponentLink2Description: JLCPCB Part URL; ComponentLink2URL: https://jlcpcb.com/partdetail/C175199
pins: 1, 2
1 alternate drawing of the same symbol

## CR2010J820RE04Z
designator R?  Resistance: 820Ω  (hidden comment: *)
Resistor, 820Ω, ±5%, 750mW, 200V, ±100ppm/℃, -55℃~+155℃, SMD 2010; Manufacturer: Uniroyal; Manufacturer Part Number: CR2010J820RE04Z; Supplier 1: LCSC; Supplier Part Number 1: C332137; JLCPCB Part Number: C332137; Power Rating: 750mW; Category: Resistors; Package Size: 2010; JLCPCB Basic Part: Yes; Tolerance: ±5%; Voltage Rating: 200V; Temperature Coefficient: ±100ppm/℃; Temperature Rating: -55℃~+155℃; ComponentLink1Description: Datasheet; ComponentLink1URL: https://wmsc.lcsc.com/wmsc/upload/file/pdf/v2/lcsc/2304140030_Ever-Ohms-Tech-CR2010J820RE04Z_C332137.pdf; ComponentLink2Description: JLCPCB Part URL; ComponentLink2URL: https://jlcpcb.com/partdetail/C332137
pins: 1, 2
1 alternate drawing of the same symbol

## CR2010J910KE04Z
designator R?  Resistance: 910kΩ  (hidden comment: *)
Resistor, 910kΩ, ±5%, 750mW, 200V, ±100ppm/℃, -55℃~+155℃, SMD 2010; Manufacturer: Uniroyal; Manufacturer Part Number: CR2010J910KE04Z; Supplier 1: LCSC; Supplier Part Number 1: C147044; JLCPCB Part Number: C147044; Power Rating: 750mW; Category: Resistors; Package Size: 2010; JLCPCB Basic Part: Yes; Tolerance: ±5%; Voltage Rating: 200V; Temperature Coefficient: ±100ppm/℃; Temperature Rating: -55℃~+155℃; ComponentLink1Description: Datasheet; ComponentLink1URL: https://wmsc.lcsc.com/wmsc/upload/file/pdf/v2/lcsc/2304140030_Ever-Ohms-Tech-CR2010J910KE04Z_C147044.pdf; ComponentLink2Description: JLCPCB Part URL; ComponentLink2URL: https://jlcpcb.com/partdetail/C147044
pins: 1, 2
1 alternate drawing of the same symbol

## CR2010J910RE04Z
designator R?  Resistance: 910Ω  (hidden comment: *)
Resistor, 910Ω, ±5%, 750mW, 200V, ±100ppm/℃, -55℃~+155℃, SMD 2010; Manufacturer: Uniroyal; Manufacturer Part Number: CR2010J910RE04Z; Supplier 1: LCSC; Supplier Part Number 1: C147120; JLCPCB Part Number: C147120; Power Rating: 750mW; Category: Resistors; Package Size: 2010; JLCPCB Basic Part: Yes; Tolerance: ±5%; Voltage Rating: 200V; Temperature Coefficient: ±100ppm/℃; Temperature Rating: -55℃~+155℃; ComponentLink1Description: Datasheet; ComponentLink1URL: https://wmsc.lcsc.com/wmsc/upload/file/pdf/v2/lcsc/2304140030_Ever-Ohms-Tech-CR2010J910RE04Z_C147120.pdf; ComponentLink2Description: JLCPCB Part URL; ComponentLink2URL: https://jlcpcb.com/partdetail/C147120
pins: 1, 2
1 alternate drawing of the same symbol

## CR2010J20224G
designator R?  Resistance: 220kΩ  (hidden comment: *)
Resistor, 220kΩ, ±5%, 200V, SMD 2010; Manufacturer: Uniroyal; Manufacturer Part Number: CR2010J20224G; Supplier 1: LCSC; Supplier Part Number 1: C3036810; JLCPCB Part Number: C3036810; Category: Resistors; Package Size: 2010; JLCPCB Basic Part: Yes; Tolerance: ±5%; Voltage Rating: 200V; ComponentLink1Description: Datasheet; ComponentLink1URL: https://wmsc.lcsc.com/wmsc/upload/file/pdf/v2/lcsc/2206281830_LIZ-Elec-CR2010J20224G_C3036810.pdf; ComponentLink2Description: JLCPCB Part URL; ComponentLink2URL: https://jlcpcb.com/partdetail/C3036810
pins: 1, 2
1 alternate drawing of the same symbol
